# Altium footprint library 2.52-直插元件.PcbLib: 467 footprints (part 24 of 30)
Each footprint in its own frame and in the unit in brackets; x right, y up, seen from the top. Pads: shape width x height; smd on the part's side, far side on the other; paste and mask are expansions set on the pad; w line width, h text height; cw(c..) or ccw(c..) is an arc to the next point about the centre after c.
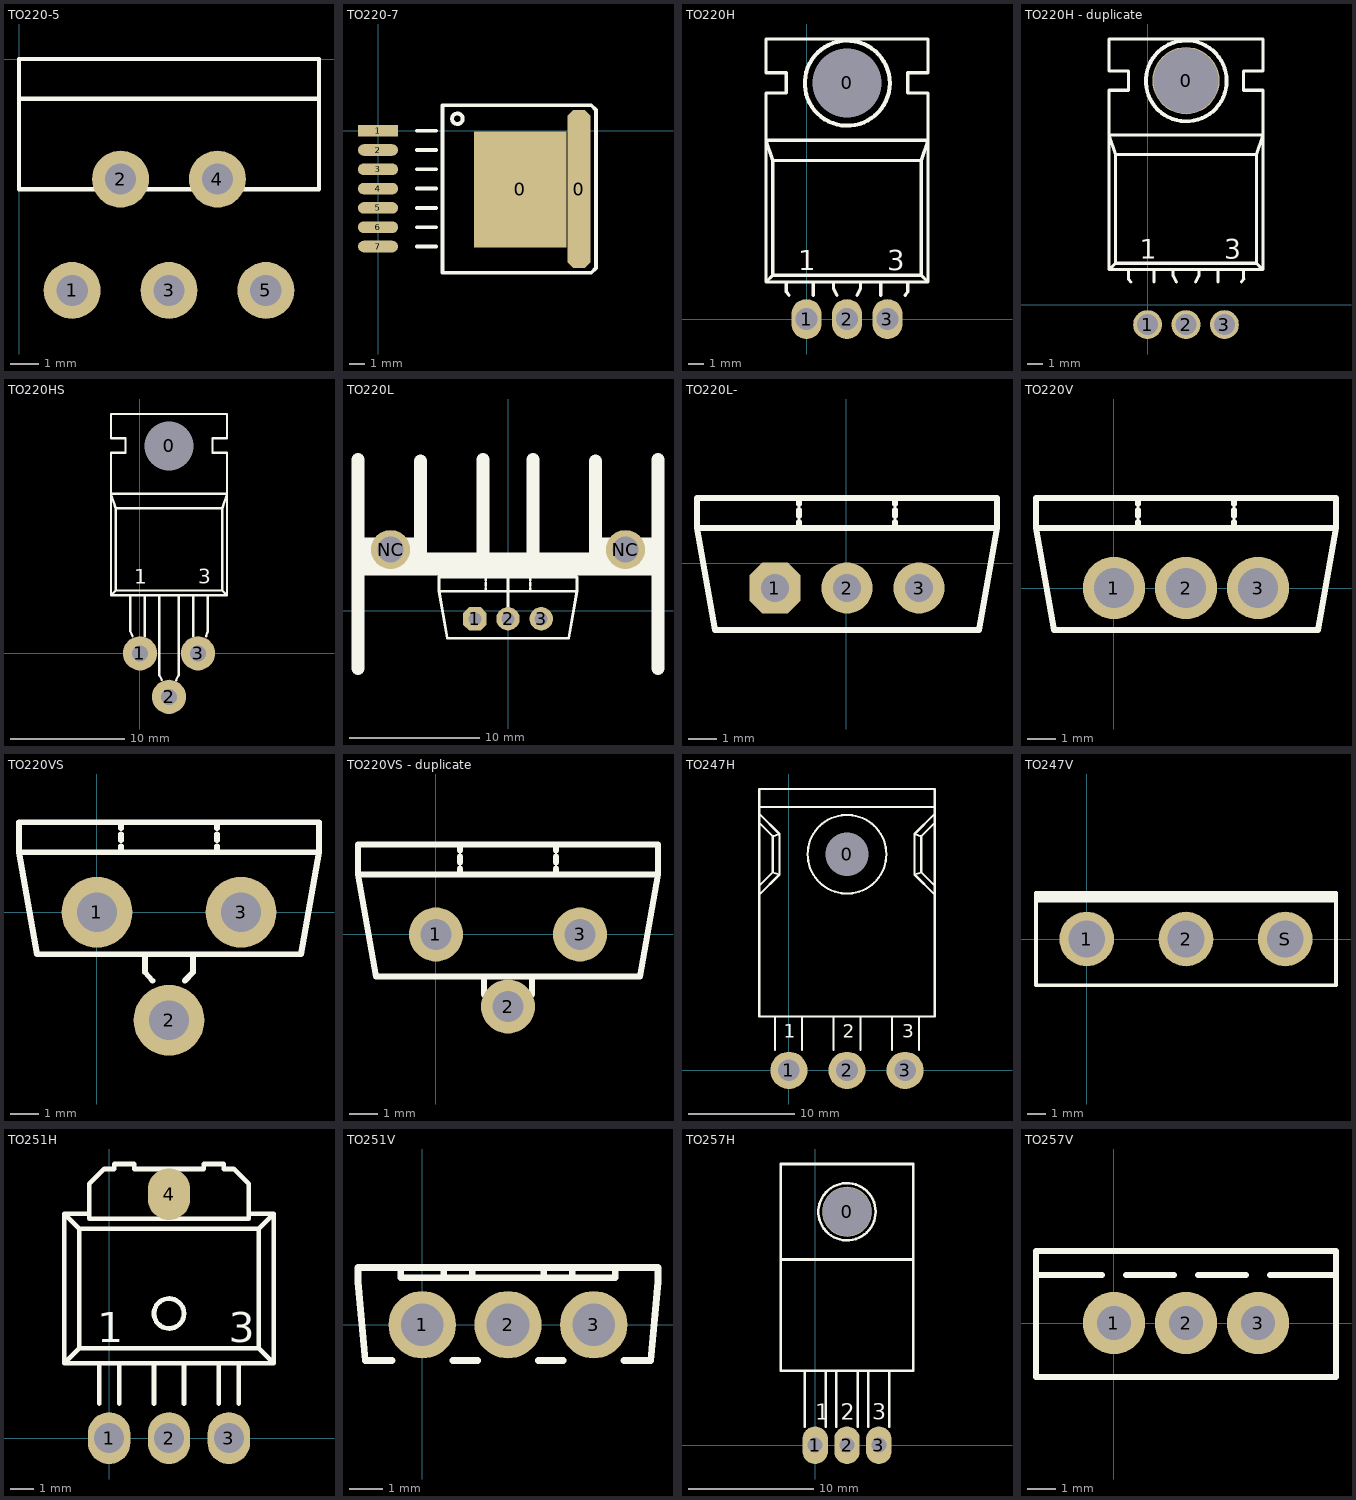
[diagram p23: the footprints below, top view; thin cyan lines are the x and y axes]

## TO220-5 [mm] "封装库来自淘宝卖家 ID：黄晶宝石"
pads (5):
  round 2 hole 1.1: 1(1.867,-8.128) 2(3.569,-4.216) 3(5.271,-8.128) 4(6.972,-4.216) 5(8.674,-8.128)
Top Overlay:
  lines w0.15: 0,-1.397 10.541,-1.397 ; 0,-4.572 0,0 10.541,0 10.541,-4.572 0,-4.572
3D body "SW3dPS-TO220-51.STEP": height 21.35, standoff -2.64, extent 0.191,-8.165 10.351,0.075

## TO220-7 [mil]
pads (9):
  rect 240x300 smd: 0(368,-152)
  oct 60x410 smd: 0(520,-151)
  rect 104x30 smd: 1(0,0)
  oval 104x30 smd: 2(0,-50) 3(0,-100) 4(0,-150) 5(0,-200) 6(0,-250) 7(0,-300)
Top Overlay:
  circle w10: c205.4,31 r13.6
  lines w10: 100,-300 150,-300 ; 100,-250 150,-250 ; 100,-200 150,-200 ; 100,-150 150,-150 ; 100,-100 150,-100 ; 100,-50 150,-50 ; 100,0 150,0 ; 167,-368 537,-368 552,-368 564,-356 564,54 552,66 537,66 167,66 167,-368

## TO220H [mm]
pads (4):
  oval 1.9x2.5 hole 4.318: 0(2.54,14.817)
  oval 1.9x2.5 hole 1.397: 1(0,0) 2(2.54,0) 3(5.08,0)
Top Overlay:
  circle w0.254: c2.557,14.796 r2.667
  lines w0.2: -1.27,1.693 -1.27,2.328 ; -1.222,1.661 -1.107,1.5 ; 0.423,1.5 0.423,2.328 ; 1.693,2.328 1.693,1.905 1.905,1.5 ; 3.175,1.5 3.387,1.905 3.387,2.328 ; 4.657,1.5 4.657,2.328 ; 6.195,1.5 6.358,1.717 ; 6.35,1.693 6.35,2.328 ; -2.54,2.328 -2.54,14.182 -1.27,14.182 -1.27,15.452 -2.54,15.452 -2.54,17.568 7.62,17.568 7.62,15.452 6.35,15.452 6.35,14.182 7.62,14.182 7.62,2.328 ; -2.54,2.328 7.62,2.328 ; -2.54,2.328 -2.117,2.752 ; -2.117,2.752 -2.117,9.948 ; -2.117,2.752 7.197,2.752 ; -2.117,9.948 -2.54,11.218 7.62,11.218 7.197,9.948 ; -2.117,9.948 7.197,9.948 ; 7.197,2.752 7.197,9.948 ; 7.197,2.752 7.62,2.328
  text "3" at 5.08,3.048 h1.27
  text "1" at -0.508,3.048 h1.27

## TO220H - duplicate [mil]
pads (4):
  round 175 hole 170: 0(100,583.33)
  round 75 hole 55: 1(0,-51.18) 2(100,-51.18) 3(200,-51.18)
Top Overlay:
  circle w10: c100.67,582.53 r105
  lines w7.87: -50,66.67 -50,91.67 ; -48.11,65.41 -43.58,59.05 ; 16.67,59.05 16.67,91.67 ; 66.67,91.67 66.67,75 75,59.05 ; 125,59.05 133.33,75 133.33,91.67 ; 183.33,59.05 183.33,91.67 ; 243.9,59.05 250.31,67.61 ; 250,66.67 250,91.67 ; -100,91.67 -100,558.33 -50,558.33 -50,608.33 -100,608.33 -100,691.67 300,691.67 300,608.33 250,608.33 250,558.33 300,558.33 300,91.67 ; -100,91.67 300,91.67 ; -100,91.67 -83.33,108.33 ; -83.33,108.33 -83.33,391.67 ; -83.33,108.33 283.33,108.33 ; -83.33,391.67 -100,441.67 300,441.67 283.33,391.67 ; -83.33,391.67 283.33,391.67 ; 283.33,108.33 283.33,391.67 ; 283.33,108.33 300,91.67
  text "3" at 200,120 h50
  text "1" at -20,120 h50
3D body "SW3DPS-TO-220-DEFAULT.step": height 165.35, standoff -118.11, extent -100,-57.6 300,709.73

## TO220HS [mm]
pads (4):
  round 3 hole 4.318: 0(2.54,18.161)
  round 3 hole 1.397: 1(0,0) 2(2.54,-3.81) 3(5.08,0)
Top Overlay:
  lines w0.2: -0.847,5.08 -0.847,1.905 -0.655,1.5 ; 0.423,1.5 0.423,5.08 ; 1.693,5.08 1.693,-1.905 1.917,-2.34 ; 3.163,-2.344 3.387,-1.905 3.387,5.08 ; 4.657,1.5 4.657,5.08 ; 5.791,1.5 5.927,1.905 5.927,5.08 ; -2.54,5.08 -2.54,17.568 -1.27,17.568 -1.27,18.838 -2.54,18.838 -2.54,20.955 7.62,20.955 7.62,18.838 6.35,18.838 6.35,17.568 7.62,17.568 7.62,15.028 7.62,5.08 ; -2.54,5.08 7.62,5.08 ; -2.54,5.08 -2.117,5.503 ; -2.117,5.503 -2.117,12.7 ; -2.117,5.503 7.197,5.503 ; -2.117,12.7 -2.54,13.97 7.62,13.97 7.197,12.7 ; -2.117,12.7 7.197,12.7 ; 7.197,5.503 7.62,5.08 ; 7.197,5.503 7.197,12.7
  text "3" at 5.08,6.096 h1.27
  text "1" at -0.508,6.096 h1.27

## TO220L [mm]
pads (5):
  oct 1.8x1.8 hole 1: 1(-2.54,-0.6)
  round 1.8 hole 1: 2(0,-0.6) 3(2.54,-0.6)
  round 3 hole 2: NC(-9,4.7) NC(9,4.7)
Top Overlay:
  lines w0.2: -11.5,3.6 -11.5,11.6 ; -5.3,2.6 -0.008,2.6 ; -5.292,2.575 -5.292,1.517 ; -1.693,1.517 -1.693,1.728 ; -1.693,1.94 -1.693,2.152 ; -1.693,2.363 -1.693,2.575 ; 0,-0.6 0,2.6 5.292,2.6 ; 1.693,1.517 1.693,1.728 ; 1.693,1.94 1.693,2.152 ; 1.693,2.363 1.693,2.575 ; 5.292,2.575 5.292,1.517 ; -5.292,1.517 -4.657,-2.082 4.657,-2.082 5.292,1.517 ; -5.292,1.517 5.292,1.517
  lines w0.35: -11.5,2.9 11.4,2.9 ; -11.5,3.1 11.5,3.1 ; -11.5,4.1 11.3,4.1 ; -11.5,4.3 11.5,4.3
  lines w0.7: -11.5,4.8 -6.7,4.8 ; -11.3,5.3 -6.7,5.3 ; 6.7,5.3 11,5.3 ; 6.9,4.8 11.2,4.8
  lines w1: -11.5,-4.4 -11.5,3.6 ; -11.5,11.6 -11.5,3.6 ; -6.7,3.6 -6.7,11.5 ; -1.9,3.6 -1.9,11.6 ; 1.9,3.6 1.9,11.6 ; 6.7,3.6 6.7,11.5 ; 11.5,-4.4 11.5,3.6 ; 11.5,11.6 11.5,3.6 ; -11.5,3.6 11.5,3.6

## TO220L- [mm]
pads (3):
  oct 1.8x1.8 hole 1: 1(-2.514,-0.876)
  round 1.8 hole 1: 2(0.026,-0.876) 3(2.566,-0.876)
Top Overlay:
  lines w0.2: -1.667,1.241 -1.667,1.452 ; -1.667,1.664 -1.667,1.876 ; -1.667,2.087 -1.667,2.299 ; 1.719,1.241 1.719,1.452 ; 1.719,1.664 1.719,1.876 ; 1.719,2.087 1.719,2.299 ; -5.266,1.241 -5.266,2.299 5.318,2.299 5.318,1.241 ; -5.266,1.241 -4.631,-2.358 4.683,-2.358 5.318,1.241 ; -5.266,1.241 5.318,1.241

## TO220V [mm]
pads (3):
  round 2.2 hole 1.397: 1(0,0) 2(2.54,0) 3(5.08,0)
Top Overlay:
  lines w0.2: 0.847,2.117 0.847,2.328 ; 0.847,2.54 0.847,2.752 ; 0.847,2.963 0.847,3.175 ; 4.233,2.117 4.233,2.328 ; 4.233,2.54 4.233,2.752 ; 4.233,2.963 4.233,3.175 ; -2.752,2.117 7.832,2.117 ; -2.752,2.117 -2.117,-1.482 7.197,-1.482 7.832,2.117 ; -2.752,2.117 -2.752,3.175 7.832,3.175 7.832,2.117

## TO220VS [mm]
pads (3):
  round 2.5 hole 1.397: 1(0,0) 2(2.54,-3.81) 3(5.08,0)
Top Overlay:
  lines w0.2: 0.847,2.117 0.847,2.328 ; 0.847,2.54 0.847,2.752 ; 0.847,2.963 0.847,3.175 ; 1.693,-1.482 1.693,-2.117 1.957,-2.416 ; 3.099,-2.416 3.387,-2.117 3.387,-1.482 ; 4.233,2.117 4.233,2.328 ; 4.233,2.54 4.233,2.752 ; 4.233,2.963 4.233,3.175 ; -2.752,2.117 7.832,2.117 ; -2.752,2.117 -2.117,-1.482 7.197,-1.482 7.832,2.117 ; -2.752,2.117 -2.752,3.175 7.832,3.175 7.832,2.117

## TO220VS - duplicate [mm]
pads (3):
  round 1.905 hole 1.1: 1(0,0) 2(2.54,-2.54) 3(5.08,0)
Top Overlay:
  lines w0.2: 0.847,2.117 0.847,2.328 ; 0.847,2.54 0.847,2.752 ; 0.847,2.963 0.847,3.175 ; 1.693,-1.482 1.693,-2.117 1.957,-2.416 ; 3.099,-2.416 3.387,-2.117 3.387,-1.482 ; 4.233,2.117 4.233,2.328 ; 4.233,2.54 4.233,2.752 ; 4.233,2.963 4.233,3.175 ; -2.752,2.117 7.832,2.117 ; -2.752,2.117 -2.117,-1.482 7.197,-1.482 7.832,2.117 ; -2.752,2.117 -2.752,3.175 7.832,3.175 7.832,2.117
3D body "User Library-TO220.STEP": height 21.21, standoff -5.95, extent -2.66,-2.838 7.74,2.903

## TO247H [mm]
pads (4):
  round 3.5 hole 4.064: 0(5.461,20.32)
  round 3.5 hole 2.032: 1(0,0) 2(5.461,0) 3(10.922,0)
Top Overlay:
  circle w0.2: c5.461,20.32 r3.698
  lines w0.2: -2.794,16.51 -0.889,18.415 ; -2.794,17.357 -1.524,18.627 ; -2.794,23.283 -1.524,22.013 ; -2.794,24.13 -0.889,22.225 ; -2.794,24.765 13.716,24.765 ; -1.312,1.905 -1.312,5.08 ; 1.228,1.905 1.228,5.08 ; 4.191,1.905 4.191,5.08 ; 6.731,1.905 6.731,5.08 ; 9.694,1.905 9.694,5.08 ; 12.234,1.905 12.234,5.08 ; 13.716,16.51 11.811,18.415 ; 13.716,17.357 12.446,18.627 ; 13.716,23.283 12.446,22.013 ; 13.716,24.13 11.811,22.225 ; -1.524,18.627 -1.524,22.013 ; -1.524,18.627 -0.889,18.415 ; -1.524,22.013 -0.889,22.225 ; -0.889,18.415 -0.889,22.225 ; 11.811,18.415 11.811,22.225 ; 11.811,18.415 12.446,18.627 ; 11.811,22.225 12.446,22.013 ; 12.446,18.627 12.446,22.013 ; -2.794,5.08 13.716,5.08 13.716,26.458 -2.794,26.458 -2.794,5.08
  text "1" at -0.508,3.048 h1.27
  text "2" at 5.08,3.048 h1.27
  text "3" at 10.668,3.048 h1.27

## TO247V [mm]
pads (3):
  round 3 hole 2.032: 1(0,0) 2(5.461,0) S(10.922,0)
Top Overlay:
  lines w0.2: -2.794,2.117 13.716,2.117 ; -2.794,2.201 13.716,2.201 ; -2.794,2.328 13.716,2.328 ; -2.794,2.413 13.716,2.413 ; -2.794,-2.54 13.716,-2.54 13.716,2.54 -2.794,2.54 -2.794,-2.54

## TO251H [mm]
pads (4):
  oval 1.8x2.2 hole 1.27: 1(0,0) 2(2.54,0) 3(5.08,0)
  oval 1.8x2.2 smd: 4(2.54,10.363)
Top Overlay:
  circle w0.203: c2.54,5.292 r0.635
  lines w0.2: -0.847,9.525 -1.905,9.525 ; -0.423,1.47 -0.423,3.175 ; 0.423,1.47 0.423,3.175 ; 1.905,1.47 1.905,3.175 ; 3.175,1.47 3.175,3.175 ; 4.657,1.47 4.657,3.175 ; 5.503,1.47 5.503,3.175 ; 5.927,9.525 6.985,9.525 ; -1.905,3.175 -1.27,3.81 ; -1.905,3.175 -1.905,9.525 ; -1.905,3.175 6.985,3.175 ; -1.905,9.525 -1.27,8.89 ; -1.27,3.81 6.35,3.81 ; -1.27,3.81 -1.27,8.89 ; -1.27,8.89 6.35,8.89 ; 6.35,3.81 6.985,3.175 ; 6.35,3.81 6.35,8.89 ; 6.35,8.89 6.985,9.525 ; 6.985,3.175 6.985,9.525 ; -0.847,9.313 5.927,9.313 5.927,10.795 5.292,11.43 4.868,11.43 4.868,11.642 4.022,11.642 4.022,11.43 1.058,11.43 1.058,11.642 0.212,11.642 0.212,11.43 -0.212,11.43 -0.847,10.795 -0.847,9.313
  text "3" at 5.08,4.064 h1.27
  text "1" at -0.508,4.064 h1.27

## TO251V [mm]
pads (3):
  round 2 hole 1.27: 1(0,0) 2(2.54,0) 3(5.08,0)
Top Overlay:
  lines w0.2: -0.9,-1.058 -1.693,-1.058 -1.905,1.27 -1.905,1.482 -1.905,1.693 6.985,1.693 6.985,1.27 6.773,-1.058 5.98,-1.058 ; -0.635,1.693 -0.635,1.389 5.715,1.389 5.715,1.693 ; 0.635,1.389 0.635,1.693 ; 0.9,-1.058 1.64,-1.058 ; 1.482,1.389 1.482,1.693 ; 3.44,-1.058 4.18,-1.058 ; 3.598,1.389 3.598,1.693 ; 4.445,1.389 4.445,1.693

## TO257H [mm]
pads (4):
  oval 3.937x4 hole 3.9: 0(2.54,18.627)
  oval 2.032x3 hole 1.2: 1(0,0) 2(2.54,0) 3(5.08,0)
Top Overlay:
  circle w0.203: c2.54,18.627 r2.286
  lines w0.2: -2.752,14.817 7.832,14.817 ; -0.847,1.482 -0.847,5.927 ; 0.847,1.482 0.847,5.927 ; 1.693,1.482 1.693,5.927 ; 3.387,1.482 3.387,5.927 ; 4.233,1.482 4.233,5.927 ; 5.927,1.482 5.927,5.927 ; -2.752,5.927 -2.752,22.437 7.832,22.437 7.832,5.927 -2.752,5.927
  text "3" at 4.572,2.032 h1.27
  text "2" at 2.032,2.032 h1.27
  text "1" at 0,2.032 h1.27

## TO257V [mm]
pads (3):
  round 2.2 hole 1.2: 1(0,0) 2(2.54,0) 3(5.08,0)
Top Overlay:
  lines w0.2: -2.752,1.693 -0.423,1.693 ; 0.423,1.693 2.117,1.693 ; 2.963,1.693 4.657,1.693 ; 5.503,1.693 7.832,1.693 ; -2.752,-1.905 -2.752,2.54 7.832,2.54 7.832,-1.905 -2.752,-1.905